# Altium footprint library IC.PcbLib: 97 footprints (part 4 of 7)
Each footprint in its own frame and in the unit in brackets; x right, y up, seen from the top. Pads: shape width x height; smd on the part's side, far side on the other; paste and mask are expansions set on the pad; w line width, h text height; cw(c..) or ccw(c..) is an arc to the next point about the centre after c.
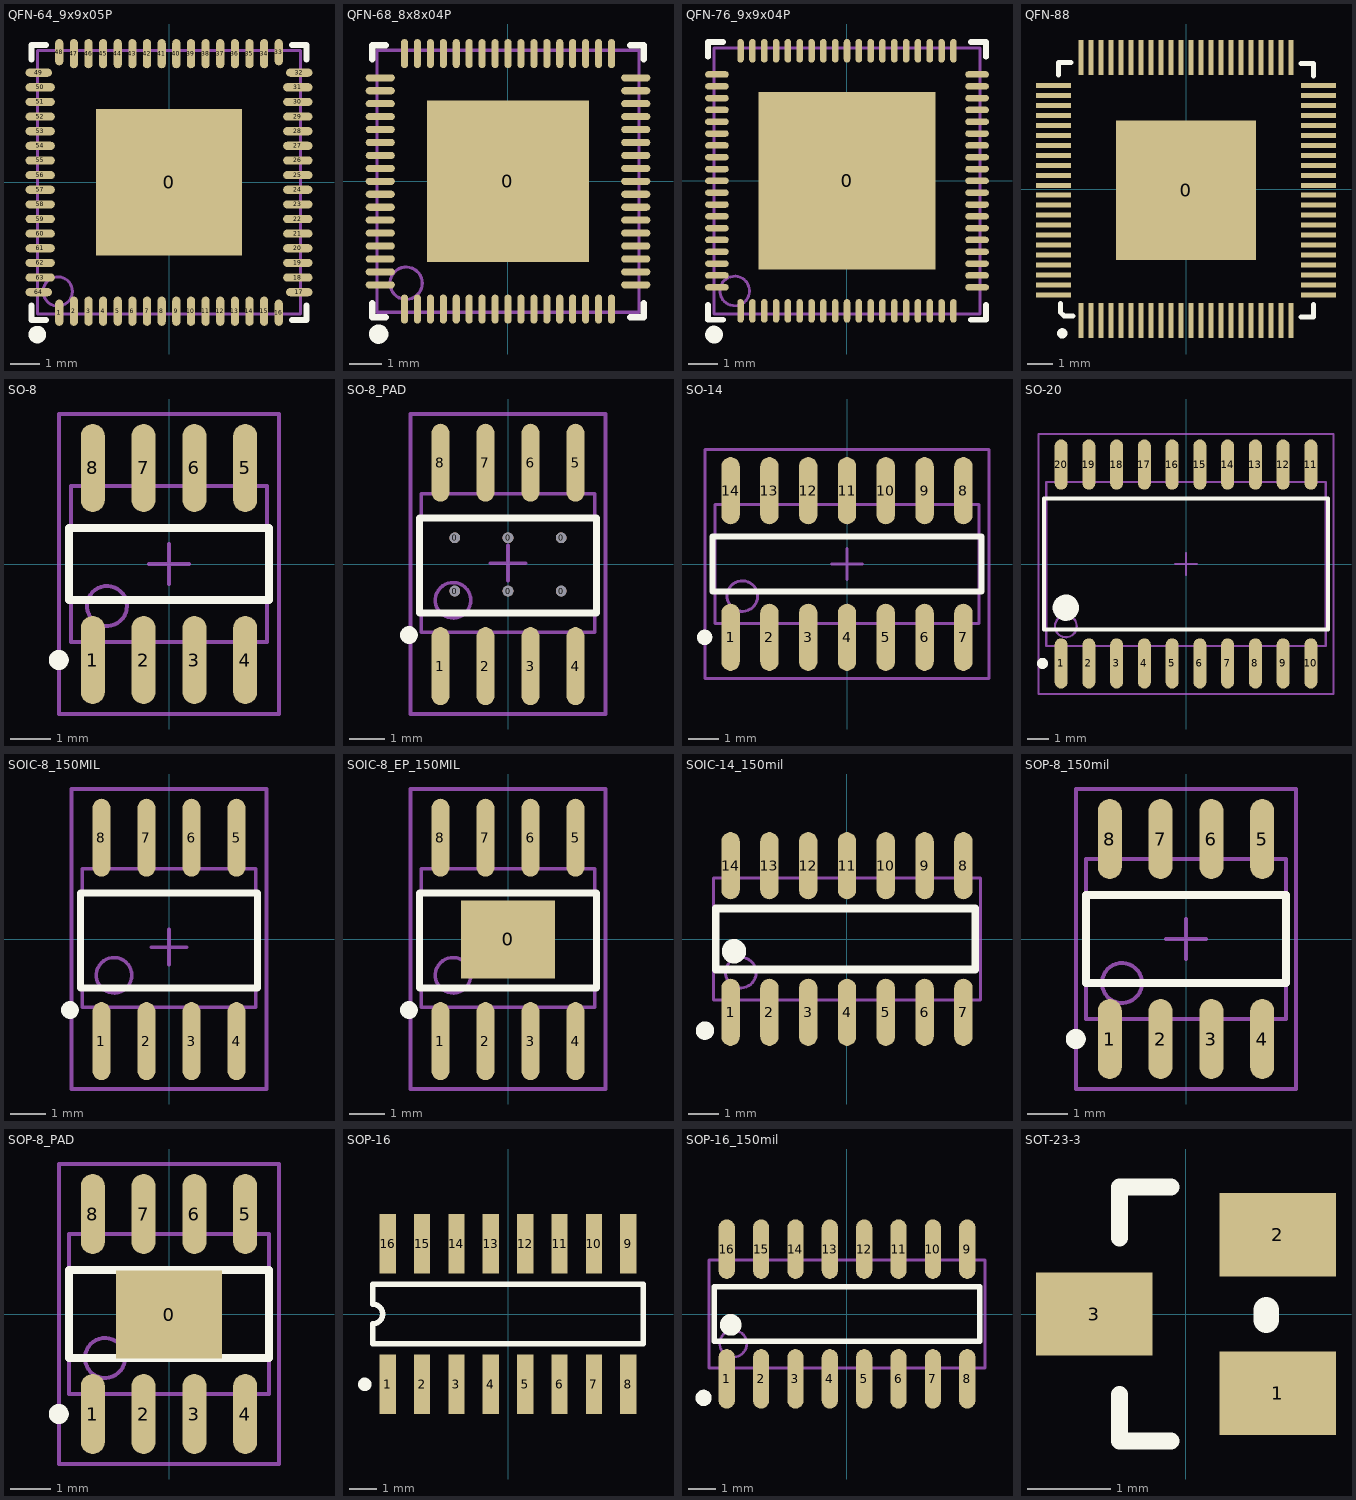
[diagram p3: the footprints below, top view; thin cyan lines are the x and y axes]

## QFN-64_9x9x05P [mm]
pads (65):
  rect 5x5 smd mask+0.051: 0(0,0)
  oval 0.28x0.9 smd mask+0.051: 1(-3.75,-4.45) 16(3.75,-4.45) 33(3.75,4.45) 48(-3.75,4.45)
  oval 0.28x1 smd mask+0.051: 2(-3.25,-4.4) 3(-2.75,-4.4) 4(-2.25,-4.4) 5(-1.75,-4.4) 6(-1.25,-4.4) 7(-0.75,-4.4) 8(-0.25,-4.4) 9(0.25,-4.4) 10(0.75,-4.4) 11(1.25,-4.4) 12(1.75,-4.4) 13(2.25,-4.4) 14(2.75,-4.4) 15(3.25,-4.4) 34(3.25,4.4) 35(2.75,4.4) 36(2.25,4.4) 37(1.75,4.4) 38(1.25,4.4) 39(0.75,4.4) 40(0.25,4.4) 41(-0.25,4.4) 42(-0.75,4.4) 43(-1.25,4.4) 44(-1.75,4.4) 45(-2.25,4.4) 46(-2.75,4.4) 47(-3.25,4.4)
  oval 0.9x0.28 smd mask+0.051: 17(4.45,-3.75) 32(4.45,3.75) 49(-4.45,3.75) 64(-4.45,-3.75)
  oval 1x0.28 smd mask+0.051: 18(4.4,-3.25) 19(4.4,-2.75) 20(4.4,-2.25) 21(4.4,-1.75) 22(4.4,-1.25) 23(4.4,-0.75) 24(4.4,-0.25) 25(4.4,0.25) 26(4.4,0.75) 27(4.4,1.25) 28(4.4,1.75) 29(4.4,2.25) 30(4.4,2.75) 31(4.4,3.25) 50(-4.4,3.25) 51(-4.4,2.75) 52(-4.4,2.25) 53(-4.4,1.75) 54(-4.4,1.25) 55(-4.4,0.75) 56(-4.4,0.25) 57(-4.4,-0.25) 58(-4.4,-0.75) 59(-4.4,-1.25) 60(-4.4,-1.75) 61(-4.4,-2.25) 62(-4.4,-2.75) 63(-4.4,-3.25)
Top Overlay:
  circle w0.3: c-4.5,-5.2 r0.15
  lines w0.2: -4.7,-4.2 -4.7,-4.7 -4.2,-4.7 ; -4.7,4.2 -4.7,4.7 -4.2,4.7 ; 4.2,-4.7 4.7,-4.7 4.7,-4.2 ; 4.2,4.7 4.7,4.7 4.7,4.2
Mechanical 13:
  circle w0.1: c-3.8,-3.725 r0.5
  lines w0.1: -4.5,-4.5 4.5,-4.5 4.5,4.5 -4.5,4.5 -4.5,-4.5

## QFN-68_8x8x04P [mm]
pads (69):
  rect 5x5 smd: 0(0,0)
  oval 0.22x0.9 smd mask+0.051: 1(-3.2,-3.95) 2(-2.8,-3.95) 3(-2.4,-3.95) 4(-2,-3.95) 5(-1.6,-3.95) 6(-1.2,-3.95) 7(-0.8,-3.95) 8(-0.4,-3.95) 9(0,-3.95) 10(0.4,-3.95) 11(0.8,-3.95) 12(1.2,-3.95) 13(1.6,-3.95) 14(2,-3.95) 15(2.4,-3.95) 16(2.8,-3.95) 17(3.2,-3.95) 35(3.2,3.95) 36(2.8,3.95) 37(2.4,3.95) 38(2,3.95) 39(1.6,3.95) 40(1.2,3.95) 41(0.8,3.95) 42(0.4,3.95) 43(0,3.95) 44(-0.4,3.95) 45(-0.8,3.95) 46(-1.2,3.95) 47(-1.6,3.95) 48(-2,3.95) 49(-2.4,3.95) 50(-2.8,3.95) 51(-3.2,3.95)
  oval 0.9x0.22 smd mask+0.051: 18(3.95,-3.2) 19(3.95,-2.8) 20(3.95,-2.4) 21(3.95,-2) 22(3.95,-1.6) 23(3.95,-1.2) 24(3.95,-0.8) 25(3.95,-0.4) 26(3.95,0) 27(3.95,0.4) 28(3.95,0.8) 29(3.95,1.2) 30(3.95,1.6) 31(3.95,2) 32(3.95,2.4) 33(3.95,2.8) 34(3.95,3.2) 52(-3.95,3.2) 53(-3.95,2.8) 54(-3.95,2.4) 55(-3.95,2) 56(-3.95,1.6) 57(-3.95,1.2) 58(-3.95,0.8) 59(-3.95,0.4) 60(-3.95,0) 61(-3.95,-0.4) 62(-3.95,-0.8) 63(-3.95,-1.2) 64(-3.95,-1.6) 65(-3.95,-2) 66(-3.95,-2.4) 67(-3.95,-2.8) 68(-3.95,-3.2)
Top Overlay:
  circle w0.3: c-4,-4.725 r0.15
  lines w0.2: -4.2,-3.775 -4.2,-4.2 -3.775,-4.2 ; -4.2,3.775 -4.2,4.2 -3.775,4.2 ; 3.775,-4.2 4.2,-4.2 4.2,-3.775 ; 3.775,4.2 4.2,4.2 4.2,3.775
Mechanical 13:
  circle w0.1: c-3.15,-3.15 r0.5
  lines w0.1: -4.05,-4.05 -4.05,4.05 4.05,4.05 4.05,-4.05 -4.05,-4.05

## QFN-76_9x9x04P [mm]
pads (77):
  rect 6x6 smd mask+0.051: 0(0,0)
  oval 0.22x0.8 smd mask+0.051: 1(-3.6,-4.4) 2(-3.2,-4.4) 3(-2.8,-4.4) 4(-2.4,-4.4) 5(-2,-4.4) 6(-1.6,-4.4) 7(-1.2,-4.4) 8(-0.8,-4.4) 9(-0.4,-4.4) 10(0,-4.4) 11(0.4,-4.4) 12(0.8,-4.4) 13(1.2,-4.4) 14(1.6,-4.4) 15(2,-4.4) 16(2.4,-4.4) 17(2.8,-4.4) 18(3.2,-4.4) 19(3.6,-4.4) 39(3.6,4.4) 40(3.2,4.4) 41(2.8,4.4) 42(2.4,4.4) 43(2,4.4) 44(1.6,4.4) 45(1.2,4.4) 46(0.8,4.4) 47(0.4,4.4) 48(0,4.4) 49(-0.4,4.4) 50(-0.8,4.4) 51(-1.2,4.4) 52(-1.6,4.4) 53(-2,4.4) 54(-2.4,4.4) 55(-2.8,4.4) 56(-3.2,4.4) 57(-3.6,4.4)
  oval 0.8x0.22 smd mask+0.051: 20(4.4,-3.6) 21(4.4,-3.2) 22(4.4,-2.8) 23(4.4,-2.4) 24(4.4,-2) 25(4.4,-1.6) 26(4.4,-1.2) 27(4.4,-0.8) 28(4.4,-0.4) 29(4.4,0) 30(4.4,0.4) 31(4.4,0.8) 32(4.4,1.2) 33(4.4,1.6) 34(4.4,2) 35(4.4,2.4) 36(4.4,2.8) 37(4.4,3.2) 38(4.4,3.6) 58(-4.4,3.6) 59(-4.4,3.2) 60(-4.4,2.8) 61(-4.4,2.4) 62(-4.4,2) 63(-4.4,1.6) 64(-4.4,1.2) 65(-4.4,0.8) 66(-4.4,0.4) 67(-4.4,0) 68(-4.4,-0.4) 69(-4.4,-0.8) 70(-4.4,-1.2) 71(-4.4,-1.6) 72(-4.4,-2) 73(-4.4,-2.4) 74(-4.4,-2.8) 75(-4.4,-3.2) 76(-4.4,-3.6)
Top Overlay:
  circle w0.3: c-4.5,-5.2 r0.15
  lines w0.2: -4.7,-4.2 -4.7,-4.7 -4.2,-4.7 ; -4.7,4.2 -4.7,4.7 -4.2,4.7 ; 4.2,-4.7 4.7,-4.7 4.7,-4.2 ; 4.2,4.7 4.7,4.7 4.7,4.2
Mechanical 13:
  circle w0.1: c-3.8,-3.725 r0.5
  lines w0.1: -4.5,-4.5 4.5,-4.5 4.5,4.5 -4.5,4.5 -4.5,-4.5

## QFN-88 [mm]
pads (89):
  rect 5.6x5.6 smd: 0(0,-0.05)
  rect 0.2x1.4 smd: 1(-4.2,-5.25) 2(-3.8,-5.25) 3(-3.4,-5.25) 4(-3,-5.25) 5(-2.6,-5.25) 6(-2.2,-5.25) 7(-1.8,-5.25) 8(-1.4,-5.25) 9(-1,-5.25) 10(-0.6,-5.25) 11(-0.2,-5.25) 12(0.2,-5.25) 13(0.6,-5.25) 14(1,-5.25) 15(1.4,-5.25) 16(1.8,-5.25) 17(2.2,-5.25) 18(2.6,-5.25) 19(3,-5.25) 20(3.4,-5.25) 21(3.8,-5.25) 22(4.2,-5.25) 45(4.2,5.25) 46(3.8,5.25) 47(3.4,5.25) 48(3,5.25) 49(2.6,5.25) 50(2.2,5.25) 51(1.8,5.25) 52(1.4,5.25) 53(1,5.25) 54(0.6,5.25) 55(0.2,5.25) 56(-0.2,5.25) 57(-0.6,5.25) 58(-1,5.25) 59(-1.4,5.25) 60(-1.8,5.25) 61(-2.2,5.25) 62(-2.6,5.25) 63(-3,5.25) 64(-3.4,5.25) 65(-3.8,5.25) 66(-4.2,5.25)
  rect 1.4x0.2 smd: 23(5.3,-4.25) 24(5.3,-3.85) 25(5.3,-3.45) 26(5.3,-3.05) 27(5.3,-2.65) 28(5.3,-2.25) 29(5.3,-1.85) 30(5.3,-1.45) 31(5.3,-1.05) 32(5.3,-0.65) 33(5.3,-0.25) 34(5.3,0.15) 35(5.3,0.55) 36(5.3,0.95) 37(5.3,1.35) 38(5.3,1.75) 39(5.3,2.15) 40(5.3,2.55) 41(5.3,2.95) 42(5.3,3.35) 43(5.3,3.75) 44(5.3,4.15) 67(-5.3,4.15) 68(-5.3,3.75) 69(-5.3,3.35) 70(-5.3,2.95) 71(-5.3,2.55) 72(-5.3,2.15) 73(-5.3,1.75) 74(-5.3,1.35) 75(-5.3,0.95) 76(-5.3,0.55) 77(-5.3,0.15) 78(-5.3,-0.25) 79(-5.3,-0.65) 80(-5.3,-1.05) 81(-5.3,-1.45) 82(-5.3,-1.85) 83(-5.3,-2.25) 84(-5.3,-2.65) 85(-5.3,-3.05) 86(-5.3,-3.45) 87(-5.3,-3.85) 88(-5.3,-4.25)
Top Overlay:
  circle w0.254: c-4.95,-5.775 r0.079
  lines w0.2: -5.1,4.55 -5.1,5.05 -4.6,5.05 ; -5.025,-4.575 -5.025,-4.931 -4.881,-5.075 -4.525,-5.075 ; 4.6,-5.125 5.1,-5.125 5.1,-4.625 ; 4.6,5.025 5.1,5.025 5.1,4.525
3D body "User Library-QFN88.step": height 0.85, standoff -0.02, extent -5.01,-5.041 5.01,4.979

## SO-8 [mm] "SOIC, 8-Leads, Body 4.9x3.9mm, Pitch 1.27mm, IPC Medium Density"
height 1.75
pads (8):
  oval 0.6x2.2 smd: 1(-1.905,-2.4) 2(-0.635,-2.4) 3(0.635,-2.4) 4(1.905,-2.4) 5(1.905,2.4) 6(0.635,2.4) 7(-0.635,2.4) 8(-1.905,2.4)
Top Overlay:
  circle w0.25: c-2.755,-2.4 r0.125
  lines w0.2: -2.5,-0.9 -2.5,0.9 2.5,0.9 2.5,-0.9 -2.5,-0.9
Mechanical 13:
  circle w0.1: c-1.55,-1.05 r0.5
  lines w0.1: -2.45,-1.95 -2.45,1.95 2.45,1.95 2.45,-1.95 -2.45,-1.95
Mechanical 15:
  lines w0.1: -0.5,0 0.5,0 ; 0,-0.5 0,0.5 ; -2.75,-3.75 -2.75,3.75 2.75,3.75 2.75,-3.75 -2.75,-3.75
3D body: height 1.75, standoff 0, extent -2.45,-1.95 2.45,1.95

## SO-8_PAD [mm]
pads (14):
  round 0.3 hole 0.3: 0(-1.5,-0.75) 0(-1.5,0.75) 0(0,-0.75) 0(0,0.75) 0(1.5,-0.75) 0(1.5,0.75)
  oval 0.5x2.2 smd: 1(-1.905,-2.869) 2(-0.635,-2.869) 3(0.635,-2.869) 4(1.905,-2.869) 5(1.905,2.869) 6(0.635,2.869) 7(-0.635,2.869) 8(-1.905,2.869)
Top Overlay:
  circle w0.25: c-2.794,-1.991 r0.125
  lines w0.2: -2.5,-1.369 2.5,-1.369 2.5,1.309 -2.5,1.309 -2.5,-1.369
Mechanical 13:
  circle w0.1: c-1.55,-1.011 r0.5
  lines w0.1: -2.45,-1.911 2.45,-1.911 2.45,1.989 -2.45,1.989 -2.45,-1.911
Mechanical 15:
  lines w0.1: -0.5,0.039 0.5,0.039 ; 0,-0.461 0,0.539 ; -2.75,-4.219 2.75,-4.219 2.75,4.243 -2.75,4.243 -2.75,-4.219
3D body: height 1.75, standoff 0, extent -2.45,-1.911 2.45,1.99

## SO-14 [mm] "SOIC, 14-Leads, Body 8.7x3.9mm, Pitch 1.27mm, IPC Medium Density"
height 1.75
pads (14):
  oval 0.6x2.2 smd: 1(-3.81,-2.4) 2(-2.54,-2.4) 3(-1.27,-2.4) 4(0,-2.4) 5(1.27,-2.4) 6(2.54,-2.4) 7(3.81,-2.4) 8(3.81,2.4) 9(2.54,2.4) 10(1.27,2.4) 11(0,2.4) 12(-1.27,2.4) 13(-2.54,2.4) 14(-3.81,2.4)
Top Overlay:
  circle w0.25: c-4.66,-2.4 r0.125
  lines w0.2: -4.4,-0.9 4.4,-0.9 4.4,0.9 -4.4,0.9 -4.4,-0.9
Mechanical 13:
  circle w0.1: c-3.425,-1.05 r0.5
  lines w0.1: -4.325,-1.95 4.325,-1.95 4.325,1.95 -4.325,1.95 -4.325,-1.95
Mechanical 15:
  lines w0.1: -0.5,0 0.5,0 ; 0,-0.5 0,0.5 ; -4.65,-3.75 4.65,-3.75 4.65,3.75 -4.65,3.75 -4.65,-3.75
3D body: height 1.75, standoff 0, extent -4.325,-1.95 4.325,1.95

## SO-20 [mm] "SOIC, 20-Leads, Body 12.8x7.5mm, Pitch 1.27mm, IPC Medium Density"
height 2.65
pads (20):
  oval 0.6x2.3 smd: 1(-5.715,-4.55) 2(-4.445,-4.55) 3(-3.175,-4.55) 4(-1.905,-4.55) 5(-0.635,-4.55) 6(0.635,-4.55) 7(1.905,-4.55) 8(3.175,-4.55) 9(4.445,-4.55) 10(5.715,-4.55) 11(5.715,4.55) 12(4.445,4.55) 13(3.175,4.55) 14(1.905,4.55) 15(0.635,4.55) 16(-0.635,4.55) 17(-1.905,4.55) 18(-3.175,4.55) 19(-4.445,4.55) 20(-5.715,4.55)
Top Overlay:
  circle w0.25: c-6.565,-4.55 r0.125
  circle w0.6: c-5.5,-2 r0.3
  lines w0.2: -6.5,-3 6.5,-3 6.5,3 -6.5,3 -6.5,-3
Mechanical 13:
  circle w0.1: c-5.5,-2.85 r0.5
  lines w0.1: -6.4,-3.75 6.4,-3.75 6.4,3.75 -6.4,3.75 -6.4,-3.75
Mechanical 15:
  lines w0.1: -0.5,0 0.5,0 ; 0,-0.5 0,0.5 ; -6.75,-5.95 6.75,-5.95 6.75,5.95 -6.75,5.95 -6.75,-5.95
3D body: height 2.65, standoff 0, extent -6.4,-3.75 6.4,3.75

## SOIC-8_150MIL [mm]
pads (8):
  oval 0.5x2.2 smd: 1(-1.905,-2.869) 2(-0.635,-2.869) 3(0.635,-2.869) 4(1.905,-2.869) 5(1.905,2.869) 6(0.635,2.869) 7(-0.635,2.869) 8(-1.905,2.869)
Top Overlay:
  circle w0.25: c-2.794,-1.991 r0.125
  lines w0.2: -2.5,-1.369 2.5,-1.369 2.5,1.309 -2.5,1.309 -2.5,-1.369
Mechanical 13:
  circle w0.1: c-1.55,-1.011 r0.5
  lines w0.1: -2.45,-1.911 2.45,-1.911 2.45,1.989 -2.45,1.989 -2.45,-1.911
Mechanical 15:
  lines w0.1: -0.5,-0.215 0.5,-0.215 ; 0,-0.715 0,0.285 ; -2.75,-4.219 2.75,-4.219 2.75,4.243 -2.75,4.243 -2.75,-4.219
3D body "User Library-SOIC-8-1.step": height 1.75, standoff 0, extent -2.45,-3.075 2.45,2.925

## SOIC-8_EP_150MIL [mm]
pads (9):
  rect 2.65x2.2 smd paste-1.07 mask+0.051: 0(0,0)
  oval 0.5x2.2 smd: 1(-1.905,-2.869) 2(-0.635,-2.869) 3(0.635,-2.869) 4(1.905,-2.869) 5(1.905,2.869) 6(0.635,2.869) 7(-0.635,2.869) 8(-1.905,2.869)
Top Overlay:
  circle w0.25: c-2.794,-1.991 r0.125
  lines w0.2: -2.5,-1.369 -2.5,1.309 2.5,1.309 2.5,-1.369 -2.5,-1.369
Mechanical 13:
  circle w0.1: c-1.55,-1.011 r0.5
  lines w0.1: -2.45,-1.911 -2.45,1.989 2.45,1.989 2.45,-1.911 -2.45,-1.911
Mechanical 15:
  lines w0.1: -0.5,-0.215 0.5,-0.215 ; 0,-0.715 0,0.285 ; -2.75,-4.219 -2.75,4.243 2.75,4.243 2.75,-4.219 -2.75,-4.219
3D body "User Library-SOIC-8-1.step": height 1.75, standoff 0, extent -2.45,-3.075 2.45,2.925

## SOIC-14_150mil [mm]
pads (14):
  oval 0.6x2.2 smd: 1(-3.81,-2.4) 2(-2.54,-2.4) 3(-1.27,-2.4) 4(0,-2.4) 5(1.27,-2.4) 6(2.54,-2.4) 7(3.81,-2.4) 8(3.81,2.4) 9(2.54,2.4) 10(1.27,2.4) 11(0,2.4) 12(-1.27,2.4) 13(-2.54,2.4) 14(-3.81,2.4)
Top Overlay:
  circle w0.4: c-3.7,-0.4 r0.2
  circle w0.3: c-4.65,-3 r0.15
  lines w0.254: -4.3,-1 -4.3,1 4.2,1 4.2,-1 -4.3,-1
Mechanical 13:
  circle w0.1: c-3.475,-1.1 r0.5
  lines w0.1: -4.375,-2 -4.375,2 4.375,2 4.375,-2 -4.375,-2
3D body "User Library-SOIC14-150.step": height 1.75, standoff 0, extent -4.275,-2.849 4.275,2.951

## SOP-8_150mil [mm] "SOIC, 8-Leads, Body 4.9x3.9mm, Pitch 1.27mm, IPC Medium Density"
height 1.75
pads (8):
  oval 0.6x2 smd: 1(-1.905,-2.5) 2(-0.635,-2.5) 3(0.635,-2.5) 4(1.905,-2.5) 5(1.905,2.5) 6(0.635,2.5) 7(-0.635,2.5) 8(-1.905,2.5)
Top Overlay:
  circle w0.25: c-2.755,-2.5 r0.125
  lines w0.2: -2.5,-1.1 2.5,-1.1 2.5,1.1 -2.5,1.1 -2.5,-1.1
Mechanical 13:
  circle w0.1: c-1.6,-1.1 r0.5
  lines w0.1: -2.5,-2 2.5,-2 2.5,2 -2.5,2 -2.5,-2
Mechanical 15:
  lines w0.1: -0.5,0 0.5,0 ; 0,-0.5 0,0.5 ; -2.75,-3.75 2.75,-3.75 2.75,3.75 -2.75,3.75 -2.75,-3.75
3D body: height 1.75, standoff 0, extent -2.5,-2 2.5,2

## SOP-8_PAD [mm] "SOIC, 8-Leads, Body 4.9x3.9mm, Pitch 1.27mm, IPC Medium Density"
height 1.75
pads (9):
  rect 2.65x2.2 smd paste-1.07 mask+0.051: 0(0,-0.013)
  oval 0.6x2 smd: 1(-1.905,-2.5) 2(-0.635,-2.5) 3(0.635,-2.5) 4(1.905,-2.5) 5(1.905,2.5) 6(0.635,2.5) 7(-0.635,2.5) 8(-1.905,2.5)
Top Overlay:
  circle w0.25: c-2.755,-2.5 r0.125
  lines w0.2: -2.5,-1.1 -2.5,1.1 2.5,1.1 2.5,-1.1 -2.5,-1.1
Mechanical 13:
  circle w0.1: c-1.6,-1.1 r0.5
  lines w0.1: -2.5,-2 -2.5,2 2.5,2 2.5,-2 -2.5,-2
Mechanical 15:
  lines w0.1: -0.487,-0.013 0.513,-0.013 ; 0,-0.5 0,0.5 ; -2.75,-3.75 -2.75,3.75 2.75,3.75 2.75,-3.75 -2.75,-3.75
3D body "User Library-FairchildSemi 8-SOP.step": height 1.7, standoff 0, extent -2.413,-2.984 2.413,3.01

## SOP-16 [mm]
pads (16):
  rect 0.6x2.2 smd: 1(-4.445,-2.6) 2(-3.175,-2.6) 3(-1.905,-2.6) 4(-0.635,-2.6) 5(0.635,-2.6) 6(1.905,-2.6) 7(3.175,-2.6) 8(4.445,-2.6) 9(4.445,2.6) 10(3.175,2.6) 11(1.905,2.6) 12(0.635,2.6) 13(-0.635,2.6) 14(-1.905,2.6) 15(-3.175,2.6) 16(-4.445,2.6)
Top Overlay:
  circle w0.25: c-5.295,-2.6 r0.125
  lines w0.2: -5,-1.1 -5,-0.367 ccw(c-5,0) -5,0.367 -5,1.1 5,1.1 5,-1.1 -5,-1.1
3D body "SO-16.STEP": height 1.4, standoff -0.05, extent -4.978,-2.972 4.997,2.972

## SOP-16_150mil [mm]
pads (16):
  oval 0.6x2.2 smd: 1(-4.445,-2.4) 2(-3.175,-2.4) 3(-1.905,-2.4) 4(-0.635,-2.4) 5(0.635,-2.4) 6(1.905,-2.4) 7(3.175,-2.4) 8(4.445,-2.4) 9(4.445,2.4) 10(3.175,2.4) 11(1.905,2.4) 12(0.635,2.4) 13(-0.635,2.4) 14(-1.905,2.4) 15(-3.175,2.4) 16(-4.445,2.4)
Top Overlay:
  circle w0.3: c-5.3,-3.1 r0.15
  circle w0.4: c-4.3,-0.4 r0.2
  lines w0.2: -4.9,-1 -4.9,1 4.9,1 4.9,-1 -4.9,-1
Mechanical 13:
  circle w0.1: c-4.205,-1.095 r0.5
  lines w0.1: -5.105,-1.995 -5.105,1.995 5.105,1.995 5.105,-1.995 -5.105,-1.995
3D body "SO-16.STEP": height 1.4, standoff -0.05, extent -4.987,-3.048 4.988,2.896

## SOT-23-3 [mm]
pads (3):
  rect 1.4x1 smd: 1(1.1,-0.95) 2(1.1,0.95) 3(-1.1,0)
Top Overlay:
  lines w0.203: -0.8,-0.965 -0.8,-1.524 -0.178,-1.524 ; -0.8,0.914 -0.8,1.524 -0.178,1.524
  lines w0.305: 0.965,-0.076 0.965,0.051
3D body "复件": height 1.09, standoff 0, extent -1.202,-1.394 1.224,1.4